# Altium schematic symbol library MiscPower.SchLib: 1552 symbols (part 15 of 22) (continued)
## LM8805TLX-3.0/NOPB (continued)

## LM8805TLX/NOPB
designator U?
Microprocessor Supervisory Circuits with Power Fail Input, Low Line Output, Manual Reset and Watchdog Timer, 9-pin Micro SMD, 3000 Reel; PartNumber: LM8805TLX/NOPB; Manufacturer: National Semiconductor; PackageTopMarking: XV*I V3; PowerWise: N; CompType: MiscPower; High-Reliability: Y; DatasheetVersion: Sep-2011; PackageVersion: revC, Jan-2004; PackageReference: TLA09ZZA; PackageDescription: Thin Micro SMD, 9 Bump (Large), 0.5mm Pitch; RoHS: Y; PinCount: 9; Code_JEDEC: MO-211-DD; ComponentLink1Description: Manufacturer URL; ComponentLink1URL: http://www.national.com/; ComponentLink2Description: LM8805 Datasheet; ComponentLink2URL: http://www.national.com/ds/LM/LM8805.pdf; ComponentLink3Description: LM8805 Web Page; ComponentLink3URL: http://www.national.com/pf/LM/LM8805.html; ComponentLink4Description: TLA09ZZA Package Page; ComponentLink4URL: http://www.national.com/packaging/folders/tla09zza.html
footprint TLA09ZZA (Micro SMD, 9-Leads, Body 1.47x1.47mm, Pitch 0.5mm, NSC Recommended)
pins: A1 MR (in), A2 PFI (in), A3 WDI (in), B1 VCC (power), B2 NC, B3 GND (power), C1 ~{RESET} (out), C2 ~{PFO} (out), C3 ~{LLO} (out)

## LM8850URE/NOPB
designator U?
High-Performance, Step-Up DC-DC Converter for High-Power Applications in Mobile Devices, 9-pin Micro SMD, 250 Reel; PartNumber: LM8850URE/NOPB; Manufacturer: National Semiconductor; PackageTopMarking: XV*I SK; PowerWise: N; CompType: MiscPower; High-Reliability: Y; DatasheetVersion: Dec-2010; PackageVersion: revA, Dec-2010; PackageReference: URA09EGA; PackageDescription: Ultra-Thin Micro SMD, 9 Bump, 0.5 mm Pitch; RoHS: Y; PinCount: 9; ComponentLink1Description: Manufacturer URL; ComponentLink1URL: http://www.national.com/; ComponentLink2Description: LM8850 Datasheet; ComponentLink2URL: http://www.national.com/ds/LM/LM8850.pdf; ComponentLink3Description: LM8850 Web Page; ComponentLink3URL: http://www.national.com/pf/LM/LM8850.html; ComponentLink4Description: URA09EGA Package Page; ComponentLink4URL: http://www.national.com/packaging/folders/ura09ega.html
footprint URA09EGA (Micro SMD, 9-Leads, Body 1.62x1.58mm, Pitch 0.5mm, NSC Recommended)
pins: A1 VIN (power), A2 SW, A3 GND (power), B1 SDA, B2 PG, B3 VOUT (power), C1 SCLK (in), C2 EN (in), C3 BAL

## LM9044V
designator U?
Lambda Sensor Interface Amplifier, 20-pin PLCC; PartNumber: LM9044V; Manufacturer: National Semiconductor; PackageTopMarking: NSUZXYTTE#*LM9044V; PowerWise: N; CompType: MiscPower; High-Reliability: Y; DatasheetVersion: Nov-2001; PackageVersion: revL, Dec-1993; PackageReference: V20A; PackageDescription: Plastic Chip Carrier, Sq., .050in Pitch, 20 Lead; RoHS: N; PinCount: 20; Code_JEDEC: MO-047-AA; Code_IPC: PLCC-20; ComponentLink1Description: Manufacturer URL; ComponentLink1URL: http://www.national.com/; ComponentLink2Description: LM9044 Datasheet; ComponentLink2URL: http://www.national.com/ds/LM/LM9044.pdf; ComponentLink3Description: LM9044 Web Page; ComponentLink3URL: http://www.national.com/pf/LM/LM9044.html; ComponentLink4Description: V20A Package Page; ComponentLink4URL: http://www.national.com/packaging/folders/v20a.html
footprint V20A_N (Leaded Chip Carrier, 20-Leads, Body 9x9mm, Pitch 1.27mm, IPC Medium Density)
footprint V20A_L (Leaded Chip Carrier, 20-Leads, Body 9x9mm, Pitch 1.27mm, IPC High Density)
footprint V20A_M (Leaded Chip Carrier, 20-Leads, Body 9x9mm, Pitch 1.27mm, IPC Low Density)
pins: 1 TRIM, 2 GND (power), 3 TRIM, 4 TRIM, 5 -IN (in), 6 TRIM, 7 +IN (in), 8 TRIM, 9 TRIM, 10 TRIM, 11 TRIM, 12 VOUT (out), 13 TRIM, 14 TRIM, 15 RF, 16 TRIM, 17 VCC (power), 18 TRIM, 19 TRIM, 20 VREF (in)

## LM9061M
designator U?
Power MOSFET Driver with Lossless Protection, 8-pin Narrow SOIC; PartNumber: LM9061M; Manufacturer: National Semiconductor; PackageTopMarking: NSZXTT*LM90*61M; PowerWise: N; CompType: MiscPower; High-Reliability: Y; DatasheetVersion: Aug-2006; PackageVersion: revM, May-2009; PackageReference: M08A; PackageDescription: SOIC Narrow, 4.9 x 3.9 x 1.45mm, 8 Lead, 1.27mm Pitch; RoHS: N; PinCount: 8; Code_JEDEC: MS-012-AA; Code_IPC: SOIC127P600-8; ComponentLink1Description: Manufacturer URL; ComponentLink1URL: http://www.national.com/; ComponentLink2Description: LM9061 Datasheet; ComponentLink2URL: http://www.national.com/ds/LM/LM9061.pdf; ComponentLink3Description: LM9061 Web Page; ComponentLink3URL: http://www.national.com/pf/LM/LM9061.html; ComponentLink4Description: M08A Package Page; ComponentLink4URL: http://www.national.com/packaging/folders/m08a.html
footprint M08A_N (SOIC, 8-Leads, Body 4.9x3.9mm, Pitch 1.27mm, IPC Medium Density)
footprint M08A_L (SOIC, 8-Leads, Body 4.9x3.9mm, Pitch 1.27mm, IPC High Density)
footprint M08A_M (SOIC, 8-Leads, Body 4.9x3.9mm, Pitch 1.27mm, IPC Low Density)
pins: 1 SENSE (in), 2 THR (in), 3 GND (power), 4 OUT (out), 5 VCC (power), 6 IREF, 7 ON/OFF (in), 8 DELAY

## LM10010SD/NOPB
designator U?
VID Voltage Programmer for Point of Load Regulator, 10-pin LLP, 1000 Reel; PartNumber: LM10010SD/NOPB; Manufacturer: National Semiconductor; PackageTopMarking: ZXYTT*L254B; PowerWise: N; CompType: MiscPower; High-Reliability: Y; DatasheetVersion: Aug-2011; PackageVersion: revA, Oct-2003; PackageReference: SDA10A; PackageDescription: LLP, Plastic, Dual, 3 x 3 x 0.8mm Body, 10 Lead, 0.5mm Pitch, No Pullback; RoHS: Y; PinCount: 10; ComponentLink1Description: Manufacturer URL; ComponentLink1URL: http://www.national.com/; ComponentLink2Description: LM10010 Datasheet; ComponentLink2URL: http://www.national.com/ds/LM/LM10010.pdf; ComponentLink3Description: LM10010 Web Page; ComponentLink3URL: http://www.national.com/pf/LM/LM10010.html; ComponentLink4Description: SDA10A Package Page; ComponentLink4URL: http://www.national.com/packaging/folders/sda10a.html
footprint SDA10A (SON, 10-Leads, Body 3x3 mm, Pitch 0.5mm, NSC Recommended)
pins: 1 GND (power), 2 IDAC_OUT (out), 3 VDD (power), 4 EN (in), 5 NC, 6 NC, 7 VIDA (in), 8 VIDB (in), 9 VIDC (in), 10 VIDS (in), 11 DAP

## LM10010SDX/NOPB
designator U?
VID Voltage Programmer for Point of Load Regulator, 10-pin LLP, 4500 Reel; PartNumber: LM10010SDX/NOPB; Manufacturer: National Semiconductor; PackageTopMarking: ZXYTT*L254B; PowerWise: N; CompType: MiscPower; High-Reliability: Y; DatasheetVersion: Aug-2011; PackageVersion: revA, Oct-2003; PackageReference: SDA10A; PackageDescription: LLP, Plastic, Dual, 3 x 3 x 0.8mm Body, 10 Lead, 0.5mm Pitch, No Pullback; RoHS: Y; PinCount: 10; ComponentLink1Description: Manufacturer URL; ComponentLink1URL: http://www.national.com/; ComponentLink2Description: LM10010 Datasheet; ComponentLink2URL: http://www.national.com/ds/LM/LM10010.pdf; ComponentLink3Description: LM10010 Web Page; ComponentLink3URL: http://www.national.com/pf/LM/LM10010.html; ComponentLink4Description: SDA10A Package Page; ComponentLink4URL: http://www.national.com/packaging/folders/sda10a.html
footprint SDA10A (SON, 10-Leads, Body 3x3 mm, Pitch 0.5mm, NSC Recommended)
pins: 1 GND (power), 2 IDAC_OUT (out), 3 VDD (power), 4 EN (in), 5 NC, 6 NC, 7 VIDA (in), 8 VIDB (in), 9 VIDC (in), 10 VIDS (in), 11 DAP

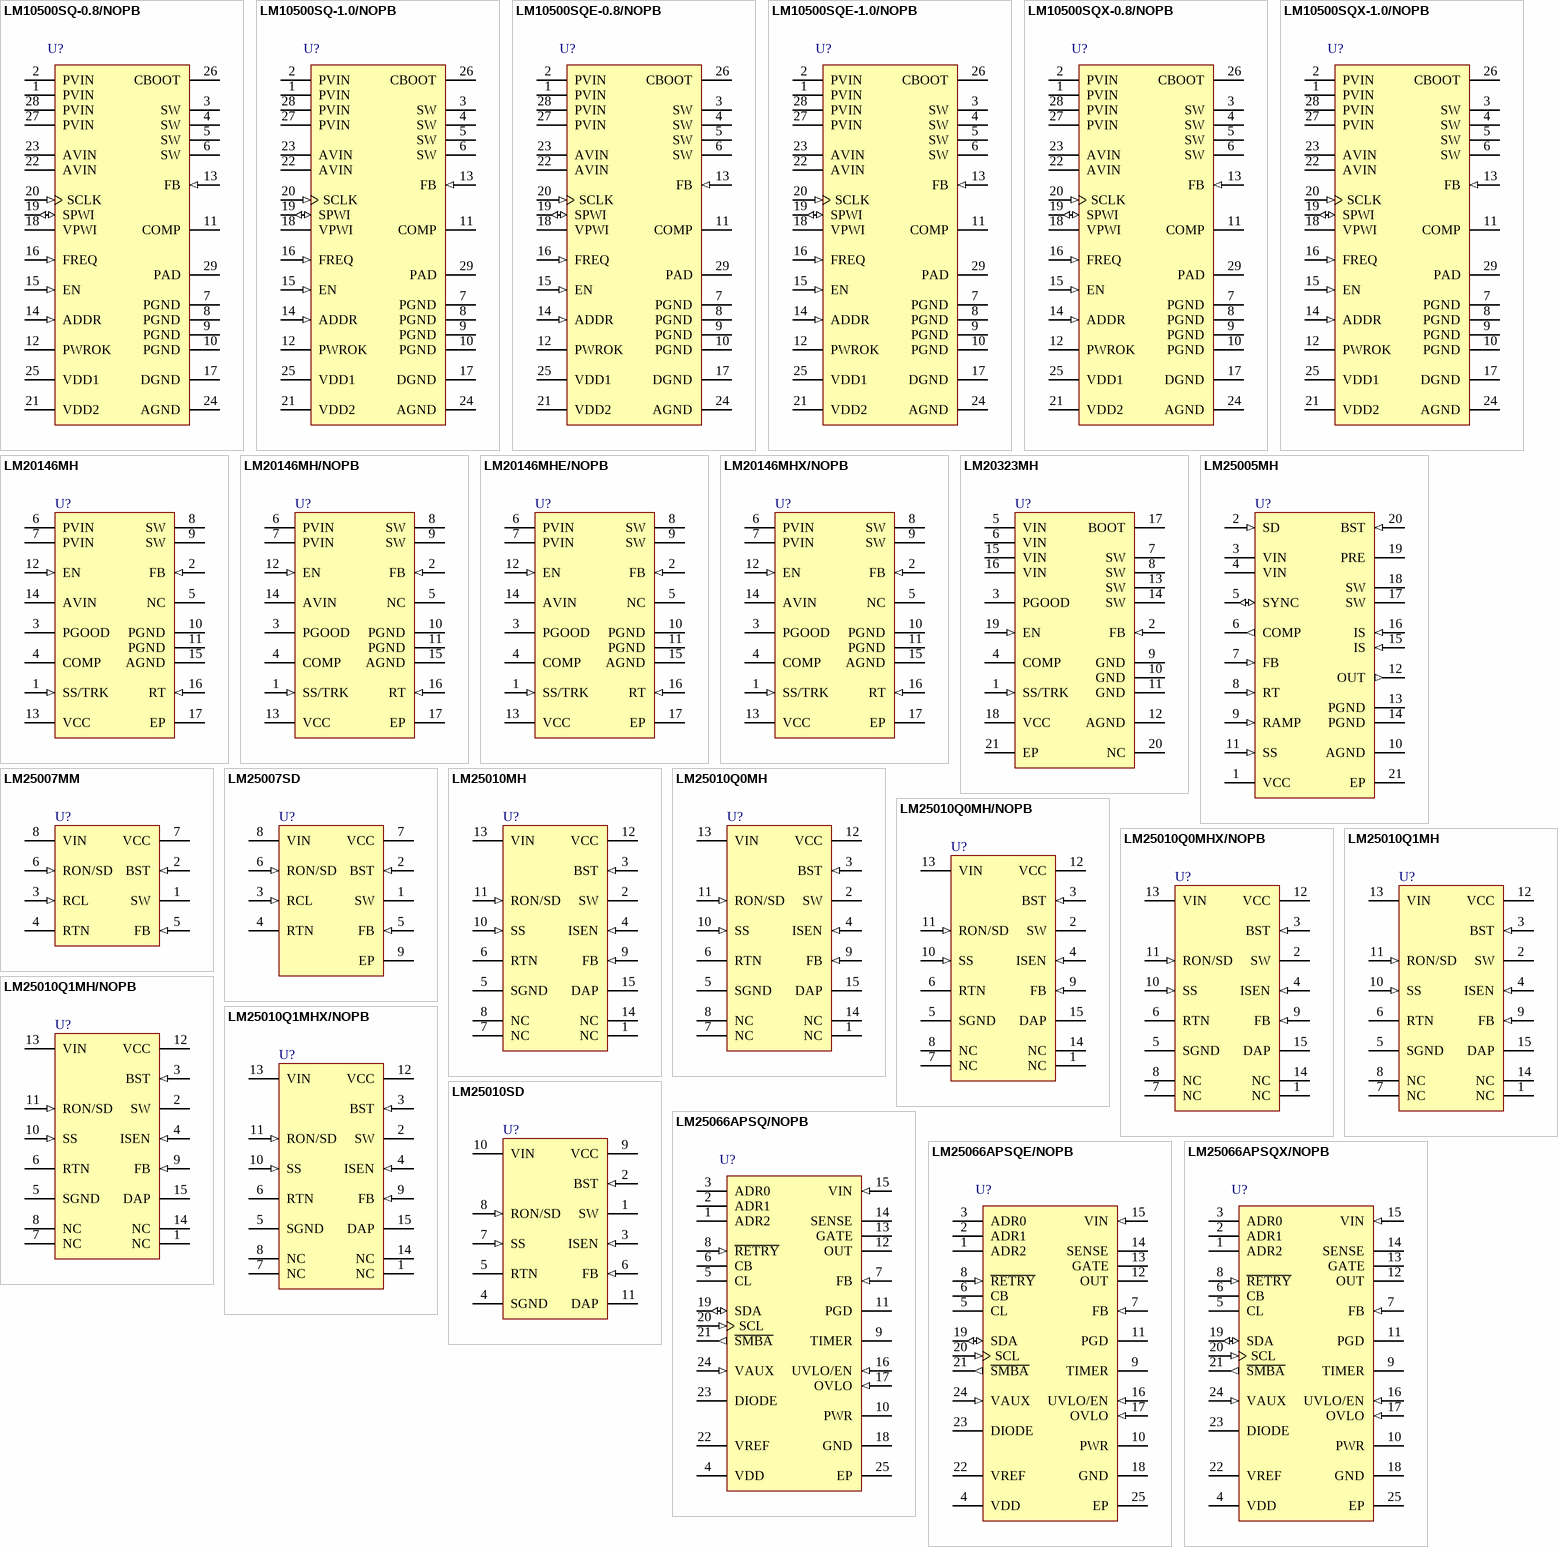
[diagram p33: symbols LM10500SQ-0.8/NOPB to LM25066APSQX/NOPB]

## LM10500SQ-0.8/NOPB
designator U?
5A Step-Down Energy Management Unit (EMU) With PowerWise® Adaptive Voltage Scaling (AVS), 28-pin LLP, 1000 Reel; PartNumber: LM10500SQ-0.8/NOPB; Manufacturer: National Semiconductor; PackageTopMarking: NS*UZXYTT*1050008; PowerWise: Y; CompType: MiscPower; DatasheetVersion: Sep-2011; PackageVersion: revB, Sep-2008; PackageReference: SQA28B; PackageDescription: LLP, Quad, 5 x 5 x 0.8mm Body, 28 Lead, 0.5mm Pitch, No Pullback, 2.8 x 2.8 mm Exposed Pad; RoHS: Y; PinCount: 28; High-Reliability: Y; Code_JEDEC: MO-220-WHHD-1; ComponentLink1Description: Manufacturer URL; ComponentLink1URL: http://www.national.com/; ComponentLink2Description: LM10500 Datasheet; ComponentLink2URL: http://www.national.com/ds/LM/LM10500.pdf; ComponentLink3Description: LM10500 Web Page; ComponentLink3URL: http://www.national.com/pf/LM/LM10500.html; ComponentLink4Description: SQA28B Package Page; ComponentLink4URL: http://www.national.com/packaging/folders/sqa28b.html
footprint SQA28B (QFN, 29-Leads, Body 5x5mm, Pitch 0.5mm, Thermal Pad 2.8x2.8mm, NSC Recommended)
pins: 1 PVIN (power), 2 PVIN (power), 3 SW (power), 4 SW (power), 5 SW (power), 6 SW (power), 7 PGND (power), 8 PGND (power), 9 PGND (power), 10 PGND (power), 11 COMP, 12 PWROK (oc), 13 FB (in), 14 ADDR (in), 15 EN (in), 16 FREQ (in), 17 DGND (power), 18 VPWI (power), 19 SPWI (io), 20 SCLK (in), 21 VDD2 (power), 22 AVIN (power), 23 AVIN (power), 24 AGND (power), 25 VDD1 (power), 26 CBOOT, 27 PVIN (power), 28 PVIN (power), 29 PAD (power)

## LM10500SQ-1.0/NOPB
designator U?
5A Step-Down Energy Management Unit (EMU) With PowerWise® Adaptive Voltage Scaling (AVS), 28-pin LLP, 1000 Reel; PartNumber: LM10500SQ-1.0/NOPB; Manufacturer: National Semiconductor; PackageTopMarking: NS*UZXYTT*1050010; PowerWise: Y; CompType: MiscPower; DatasheetVersion: Sep-2011; PackageVersion: revB, Sep-2008; PackageReference: SQA28B; PackageDescription: LLP, Quad, 5 x 5 x 0.8mm Body, 28 Lead, 0.5mm Pitch, No Pullback, 2.8 x 2.8 mm Exposed Pad; RoHS: Y; PinCount: 28; High-Reliability: Y; Code_JEDEC: MO-220-WHHD-1; ComponentLink1Description: Manufacturer URL; ComponentLink1URL: http://www.national.com/; ComponentLink2Description: LM10500 Datasheet; ComponentLink2URL: http://www.national.com/ds/LM/LM10500.pdf; ComponentLink3Description: LM10500 Web Page; ComponentLink3URL: http://www.national.com/pf/LM/LM10500.html; ComponentLink4Description: SQA28B Package Page; ComponentLink4URL: http://www.national.com/packaging/folders/sqa28b.html
footprint SQA28B (QFN, 29-Leads, Body 5x5mm, Pitch 0.5mm, Thermal Pad 2.8x2.8mm, NSC Recommended)
pins: 1 PVIN (power), 2 PVIN (power), 3 SW (power), 4 SW (power), 5 SW (power), 6 SW (power), 7 PGND (power), 8 PGND (power), 9 PGND (power), 10 PGND (power), 11 COMP, 12 PWROK (oc), 13 FB (in), 14 ADDR (in), 15 EN (in), 16 FREQ (in), 17 DGND (power), 18 VPWI (power), 19 SPWI (io), 20 SCLK (in), 21 VDD2 (power), 22 AVIN (power), 23 AVIN (power), 24 AGND (power), 25 VDD1 (power), 26 CBOOT, 27 PVIN (power), 28 PVIN (power), 29 PAD (power)

## LM10500SQE-0.8/NOPB
designator U?
5A Step-Down Energy Management Unit (EMU) With PowerWise® Adaptive Voltage Scaling (AVS), 28-pin LLP, 2520 Reel; PartNumber: LM10500SQE-0.8/NOPB; Manufacturer: National Semiconductor; PackageTopMarking: NS*UZXYTT*1050008; PowerWise: N; CompType: MiscPower; High-Reliability: Y; DatasheetVersion: Sep-2011; PackageVersion: revB, Sep-2008; PackageReference: SQA28B; PackageDescription: LLP, Quad, 5 x 5 x 0.8mm Body, 28 Lead, 0.5mm Pitch, No Pullback, 2.8 x 2.8 mm Exposed Pad; RoHS: Y; PinCount: 28; Code_JEDEC: MO-220-WHHD-1; ComponentLink1Description: Manufacturer URL; ComponentLink1URL: http://www.national.com/; ComponentLink2Description: LM10500 Datasheet; ComponentLink2URL: http://www.national.com/ds/LM/LM10500.pdf; ComponentLink3Description: LM10500 Web Page; ComponentLink3URL: http://www.national.com/pf/LM/LM10500.html; ComponentLink4Description: SQA28B Package Page; ComponentLink4URL: http://www.national.com/packaging/folders/sqa28b.html
footprint SQA28B (QFN, 29-Leads, Body 5x5mm, Pitch 0.5mm, Thermal Pad 2.8x2.8mm, NSC Recommended)
pins: 1 PVIN (power), 2 PVIN (power), 3 SW (power), 4 SW (power), 5 SW (power), 6 SW (power), 7 PGND (power), 8 PGND (power), 9 PGND (power), 10 PGND (power), 11 COMP, 12 PWROK (oc), 13 FB (in), 14 ADDR (in), 15 EN (in), 16 FREQ (in), 17 DGND (power), 18 VPWI (power), 19 SPWI (io), 20 SCLK (in), 21 VDD2 (power), 22 AVIN (power), 23 AVIN (power), 24 AGND (power), 25 VDD1 (power), 26 CBOOT, 27 PVIN (power), 28 PVIN (power), 29 PAD (power)

## LM10500SQE-1.0/NOPB
designator U?
5A Step-Down Energy Management Unit (EMU) With PowerWise® Adaptive Voltage Scaling (AVS), 28-pin LLP, 2520 Reel; PartNumber: LM10500SQE-1.0/NOPB; Manufacturer: National Semiconductor; PackageTopMarking: NS*UZXYTT*1050010; PowerWise: N; CompType: MiscPower; High-Reliability: Y; DatasheetVersion: Sep-2011; PackageVersion: revB, Sep-2008; PackageReference: SQA28B; PackageDescription: LLP, Quad, 5 x 5 x 0.8mm Body, 28 Lead, 0.5mm Pitch, No Pullback, 2.8 x 2.8 mm Exposed Pad; RoHS: Y; PinCount: 28; Code_JEDEC: MO-220-WHHD-1; ComponentLink1Description: Manufacturer URL; ComponentLink1URL: http://www.national.com/; ComponentLink2Description: LM10500 Datasheet; ComponentLink2URL: http://www.national.com/ds/LM/LM10500.pdf; ComponentLink3Description: LM10500 Web Page; ComponentLink3URL: http://www.national.com/pf/LM/LM10500.html; ComponentLink4Description: SQA28B Package Page; ComponentLink4URL: http://www.national.com/packaging/folders/sqa28b.html
footprint SQA28B (QFN, 29-Leads, Body 5x5mm, Pitch 0.5mm, Thermal Pad 2.8x2.8mm, NSC Recommended)
pins: 1 PVIN (power), 2 PVIN (power), 3 SW (power), 4 SW (power), 5 SW (power), 6 SW (power), 7 PGND (power), 8 PGND (power), 9 PGND (power), 10 PGND (power), 11 COMP, 12 PWROK (oc), 13 FB (in), 14 ADDR (in), 15 EN (in), 16 FREQ (in), 17 DGND (power), 18 VPWI (power), 19 SPWI (io), 20 SCLK (in), 21 VDD2 (power), 22 AVIN (power), 23 AVIN (power), 24 AGND (power), 25 VDD1 (power), 26 CBOOT, 27 PVIN (power), 28 PVIN (power), 29 PAD (power)

## LM10500SQX-0.8/NOPB
designator U?
5A Step-Down Energy Management Unit (EMU) With PowerWise® Adaptive Voltage Scaling (AVS), 28-pin LLP, 4500 Reel; PartNumber: LM10500SQX-0.8/NOPB; Manufacturer: National Semiconductor; PackageTopMarking: NS*UZXYTT*1050008; PowerWise: Y; CompType: MiscPower; DatasheetVersion: Sep-2011; PackageVersion: revB, Sep-2008; PackageReference: SQA28B; PackageDescription: LLP, Quad, 5 x 5 x 0.8mm Body, 28 Lead, 0.5mm Pitch, No Pullback, 2.8 x 2.8 mm Exposed Pad; RoHS: Y; PinCount: 28; High-Reliability: Y; Code_JEDEC: MO-220-WHHD-1; ComponentLink1Description: Manufacturer URL; ComponentLink1URL: http://www.national.com/; ComponentLink2Description: LM10500 Datasheet; ComponentLink2URL: http://www.national.com/ds/LM/LM10500.pdf; ComponentLink3Description: LM10500 Web Page; ComponentLink3URL: http://www.national.com/pf/LM/LM10500.html; ComponentLink4Description: SQA28B Package Page; ComponentLink4URL: http://www.national.com/packaging/folders/sqa28b.html
footprint SQA28B (QFN, 29-Leads, Body 5x5mm, Pitch 0.5mm, Thermal Pad 2.8x2.8mm, NSC Recommended)
pins: 1 PVIN (power), 2 PVIN (power), 3 SW (power), 4 SW (power), 5 SW (power), 6 SW (power), 7 PGND (power), 8 PGND (power), 9 PGND (power), 10 PGND (power), 11 COMP, 12 PWROK (oc), 13 FB (in), 14 ADDR (in), 15 EN (in), 16 FREQ (in), 17 DGND (power), 18 VPWI (power), 19 SPWI (io), 20 SCLK (in), 21 VDD2 (power), 22 AVIN (power), 23 AVIN (power), 24 AGND (power), 25 VDD1 (power), 26 CBOOT, 27 PVIN (power), 28 PVIN (power), 29 PAD (power)

## LM10500SQX-1.0/NOPB
designator U?
5A Step-Down Energy Management Unit (EMU) With PowerWise® Adaptive Voltage Scaling (AVS), 28-pin LLP, 4500 Reel; PartNumber: LM10500SQX-1.0/NOPB; Manufacturer: National Semiconductor; PackageTopMarking: NS*UZXYTT*1050010; PowerWise: Y; CompType: MiscPower; DatasheetVersion: Sep-2011; PackageVersion: revB, Sep-2008; PackageReference: SQA28B; PackageDescription: LLP, Quad, 5 x 5 x 0.8mm Body, 28 Lead, 0.5mm Pitch, No Pullback, 2.8 x 2.8 mm Exposed Pad; RoHS: Y; PinCount: 28; High-Reliability: Y; Code_JEDEC: MO-220-WHHD-1; ComponentLink1Description: Manufacturer URL; ComponentLink1URL: http://www.national.com/; ComponentLink2Description: LM10500 Datasheet; ComponentLink2URL: http://www.national.com/ds/LM/LM10500.pdf; ComponentLink3Description: LM10500 Web Page; ComponentLink3URL: http://www.national.com/pf/LM/LM10500.html; ComponentLink4Description: SQA28B Package Page; ComponentLink4URL: http://www.national.com/packaging/folders/sqa28b.html
footprint SQA28B (QFN, 29-Leads, Body 5x5mm, Pitch 0.5mm, Thermal Pad 2.8x2.8mm, NSC Recommended)
pins: 1 PVIN (power), 2 PVIN (power), 3 SW (power), 4 SW (power), 5 SW (power), 6 SW (power), 7 PGND (power), 8 PGND (power), 9 PGND (power), 10 PGND (power), 11 COMP, 12 PWROK (oc), 13 FB (in), 14 ADDR (in), 15 EN (in), 16 FREQ (in), 17 DGND (power), 18 VPWI (power), 19 SPWI (io), 20 SCLK (in), 21 VDD2 (power), 22 AVIN (power), 23 AVIN (power), 24 AGND (power), 25 VDD1 (power), 26 CBOOT, 27 PVIN (power), 28 PVIN (power), 29 PAD (power)

## LM20146MH
designator U?
6A, Adjustable Frequency Synchronous Buck Regulator, 16-pin TSSOP-EP; PartNumber: LM20146MH; Manufacturer: National Semiconductor; PackageTopMarking: NSUZXYTT*L20146*MH; PowerWise: Y; CompType: MiscPower; DatasheetVersion: Feb-2009; PackageVersion: revA, Apr-2003; PackageReference: MXA16A; PackageDescription: Molded TSSOP, Jedec, Exposed Pad, 5.0 x 4.4 x 0.9mm Body,16 Lead, 0.65mm Pitch; RoHS: Y; PinCount: 16; High-Reliability: Y; Code_JEDEC: MO-153-ABT; ComponentLink1Description: Manufacturer URL; ComponentLink1URL: http://www.national.com/; ComponentLink2Description: LM20146 Datasheet; ComponentLink2URL: http://www.national.com/ds/LM/LM20146.pdf; ComponentLink3Description: LM20146 Web Page; ComponentLink3URL: http://www.national.com/pf/LM/LM20146.html; ComponentLink4Description: MXA16A Package Page; ComponentLink4URL: http://www.national.com/packaging/folders/mxa16a.html
footprint MXA16A_N (TSOP, 16-Leads, Body 5x4.4mm, Pitch 0.65mm, Thermal Pad, IPC Medium Density)
footprint MXA16A_L (TSOP, 16-Leads, Body 5x4.4mm, Pitch 0.65mm, Thermal Pad, IPC High Density)
footprint MXA16A_M (TSOP, 16-Leads, Body 5x4.4mm, Pitch 0.65mm, Thermal Pad, IPC Low Density)
pins: 1 SS/TRK (in), 2 FB (in), 3 PGOOD (oc), 4 COMP, 5 NC, 6 PVIN (power), 7 PVIN (power), 8 SW (power), 9 SW (power), 10 PGND (power), 11 PGND (power), 12 EN (in), 13 VCC (power), 14 AVIN (power), 15 AGND (power), 16 RT (in), 17 EP (power)

## LM20146MH/NOPB
designator U?
6A, Adjustable Frequency Synchronous Buck Regulator, 16-pin TSSOP-EP, Pb-Free; PartNumber: LM20146MH/NOPB; Manufacturer: National Semiconductor; PackageTopMarking: NSUZXYTT*L20146*MH; PowerWise: Y; CompType: MiscPower; DatasheetVersion: Feb-2009; PackageVersion: revA, Apr-2003; PackageReference: MXA16A; PackageDescription: Molded TSSOP, Jedec, Exposed Pad, 5.0 x 4.4 x 0.9mm Body,16 Lead, 0.65mm Pitch; RoHS: Y; PinCount: 16; High-Reliability: Y; Code_JEDEC: MO-153-ABT; ComponentLink1Description: Manufacturer URL; ComponentLink1URL: http://www.national.com/; ComponentLink2Description: LM20146 Datasheet; ComponentLink2URL: http://www.national.com/ds/LM/LM20146.pdf; ComponentLink3Description: LM20146 Web Page; ComponentLink3URL: http://www.national.com/pf/LM/LM20146.html; ComponentLink4Description: MXA16A Package Page; ComponentLink4URL: http://www.national.com/packaging/folders/mxa16a.html
footprint MXA16A_N (TSOP, 16-Leads, Body 5x4.4mm, Pitch 0.65mm, Thermal Pad, IPC Medium Density)
footprint MXA16A_L (TSOP, 16-Leads, Body 5x4.4mm, Pitch 0.65mm, Thermal Pad, IPC High Density)
footprint MXA16A_M (TSOP, 16-Leads, Body 5x4.4mm, Pitch 0.65mm, Thermal Pad, IPC Low Density)
pins: 1 SS/TRK (in), 2 FB (in), 3 PGOOD (oc), 4 COMP, 5 NC, 6 PVIN (power), 7 PVIN (power), 8 SW (power), 9 SW (power), 10 PGND (power), 11 PGND (power), 12 EN (in), 13 VCC (power), 14 AVIN (power), 15 AGND (power), 16 RT (in), 17 EP (power)

## LM20146MHE/NOPB
designator U?
6A, Adjustable Frequency Synchronous Buck Regulator, 16-pin TSSOP-EP, Pb-Free; PartNumber: LM20146MHE/NOPB; Manufacturer: National Semiconductor; PackageTopMarking: NSUZXYTT*L20146*MH; PowerWise: Y; CompType: MiscPower; DatasheetVersion: Feb-2009; PackageVersion: revA, Apr-2003; PackageReference: MXA16A; PackageDescription: Molded TSSOP, Jedec, Exposed Pad, 5.0 x 4.4 x 0.9mm Body,16 Lead, 0.65mm Pitch; RoHS: Y; PinCount: 16; High-Reliability: Y; Code_JEDEC: MO-153-ABT; ComponentLink1Description: Manufacturer URL; ComponentLink1URL: http://www.national.com/; ComponentLink2Description: LM20146 Datasheet; ComponentLink2URL: http://www.national.com/ds/LM/LM20146.pdf; ComponentLink3Description: LM20146 Web Page; ComponentLink3URL: http://www.national.com/pf/LM/LM20146.html; ComponentLink4Description: MXA16A Package Page; ComponentLink4URL: http://www.national.com/packaging/folders/mxa16a.html
footprint MXA16A_N (TSOP, 16-Leads, Body 5x4.4mm, Pitch 0.65mm, Thermal Pad, IPC Medium Density)
footprint MXA16A_L (TSOP, 16-Leads, Body 5x4.4mm, Pitch 0.65mm, Thermal Pad, IPC High Density)
footprint MXA16A_M (TSOP, 16-Leads, Body 5x4.4mm, Pitch 0.65mm, Thermal Pad, IPC Low Density)
pins: 1 SS/TRK (in), 2 FB (in), 3 PGOOD (oc), 4 COMP, 5 NC, 6 PVIN (power), 7 PVIN (power), 8 SW (power), 9 SW (power), 10 PGND (power), 11 PGND (power), 12 EN (in), 13 VCC (power), 14 AVIN (power), 15 AGND (power), 16 RT (in), 17 EP (power)

## LM20146MHX/NOPB
designator U?
6A, Adjustable Frequency Synchronous Buck Regulator, 16-pin TSSOP-EP, Pb-Free; PartNumber: LM20146MHX/NOPB; Manufacturer: National Semiconductor; PackageTopMarking: NSUZXYTT*L20146*MH; PowerWise: Y; CompType: MiscPower; DatasheetVersion: Feb-2009; PackageVersion: revA, Apr-2003; PackageReference: MXA16A; PackageDescription: Molded TSSOP, Jedec, Exposed Pad, 5.0 x 4.4 x 0.9mm Body,16 Lead, 0.65mm Pitch; RoHS: Y; PinCount: 16; High-Reliability: Y; Code_JEDEC: MO-153-ABT; ComponentLink1Description: Manufacturer URL; ComponentLink1URL: http://www.national.com/; ComponentLink2Description: LM20146 Datasheet; ComponentLink2URL: http://www.national.com/ds/LM/LM20146.pdf; ComponentLink3Description: LM20146 Web Page; ComponentLink3URL: http://www.national.com/pf/LM/LM20146.html; ComponentLink4Description: MXA16A Package Page; ComponentLink4URL: http://www.national.com/packaging/folders/mxa16a.html
footprint MXA16A_N (TSOP, 16-Leads, Body 5x4.4mm, Pitch 0.65mm, Thermal Pad, IPC Medium Density)
footprint MXA16A_L (TSOP, 16-Leads, Body 5x4.4mm, Pitch 0.65mm, Thermal Pad, IPC High Density)
footprint MXA16A_M (TSOP, 16-Leads, Body 5x4.4mm, Pitch 0.65mm, Thermal Pad, IPC Low Density)
pins: 1 SS/TRK (in), 2 FB (in), 3 PGOOD (oc), 4 COMP, 5 NC, 6 PVIN (power), 7 PVIN (power), 8 SW (power), 9 SW (power), 10 PGND (power), 11 PGND (power), 12 EN (in), 13 VCC (power), 14 AVIN (power), 15 AGND (power), 16 RT (in), 17 EP (power)

## LM20323MH
designator U?
36V,3A PowerWise 500 kHz Synchronous Buck Regulator Adjustable Frequency Synchronous Buck Regulator, 20-pin TSSOP-EP; PartNumber: LM20323MH; Manufacturer: National Semiconductor; PackageTopMarking: NSUZXYTT*20323MH; PowerWise: Y; CompType: MiscPower; DatasheetVersion: Jan-2009; PackageVersion: revC, Jul-2006; PackageReference: MXA20A; PackageDescription: Molded TSSOP, Jedec, 6.5 x 4.4 x 0.9mm Body, 20 Lead, 0.65mm Pitch, Exposed Pad; RoHS: Y; PinCount: 20; High-Reliability: Y; Code_JEDEC: MO-153-ACT; ComponentLink1Description: Manufacturer URL; ComponentLink1URL: http://www.national.com/; ComponentLink2Description: LM20323 Datasheet; ComponentLink2URL: http://www.national.com/ds/LM/LM20323.pdf; ComponentLink3Description: LM20323 Web Page; ComponentLink3URL: http://www.national.com/pf/LM/LM20323.html; ComponentLink4Description: MXA20A Package Page; ComponentLink4URL: http://www.national.com/packaging/folders/mxa20a.html
footprint MXA20A_N (TSOP, 20-Leads, Body 6.5x4.4mm, Pitch 0.65mm, Thermal Pad, IPC Medium Density)
footprint MXA20A_L (TSOP, 20-Leads, Body 6.5x4.4mm, Pitch 0.65mm, Thermal Pad, IPC High Density)
footprint MXA20A_M (TSOP, 20-Leads, Body 6.5x4.4mm, Pitch 0.65mm, Thermal Pad, IPC Low Density)
pins: 1 SS/TRK (in), 2 FB (in), 3 PGOOD (oc), 4 COMP, 5 VIN (power), 6 VIN (power), 7 SW (power), 8 SW (power), 9 GND (power), 10 GND (power), 11 GND (power), 12 AGND (power), 13 SW (power), 14 SW (power), 15 VIN (power), 16 VIN (power), 17 BOOT, 18 VCC (power), 19 EN (in), 20 NC, 21 EP (power)
